# Altium schematic symbol library AA_Symbols.SchLib: 1017 symbols (part 6 of 7)
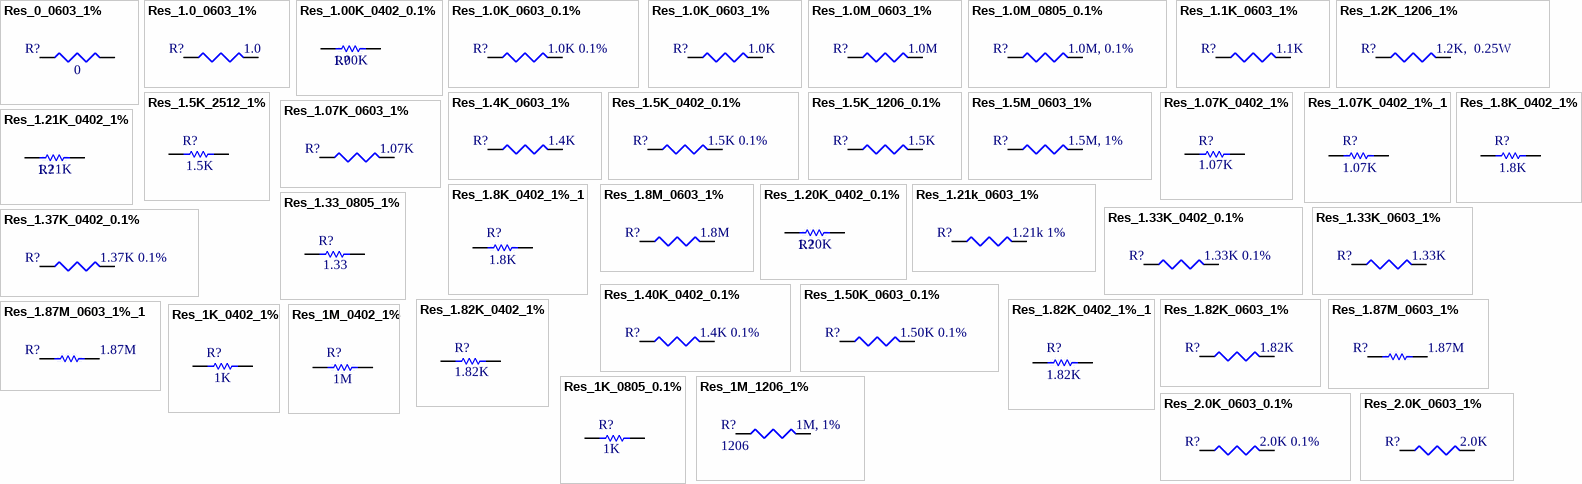
[diagram p47: symbols Res_0_0603_1% to Res_2.0K_0603_1%]

## Res_1.07K_0603_1%
designator R?, comment 1.07K
Resistor, 1.07K, 0603, 1%; Manufacturer: Stackpole; Manufacturer P/N: RMCF0603FT1K07; Outset P/N: 0000219; Value: 1.07K
footprint RC_1608_0603_N
pins: 1, 2

## Res_1.8K_0402_1%
designator R?, comment 1.8K
Resistor, 1.8K, 0402, 1%, 1/10W; Manufacturer P/N: ERJ-2RKF1801X; Manufacturer: Panasonic-ECG; Outset P/N: PN-0007234; TempCo: 100ppm/C; TOLERANCE: 1%; POWER: 1/10W; Value: 1.8K
footprint RC_1005_0402_L
footprint RC_1005_0402_N
pins: 1, 2

## Res_1.8K_0402_1%_1
designator R?, comment 1.8K
Resistor, 1.8K, 0402, 1%, 1/10W; Manufacturer P/N: ERJ-2RKF1801X; Manufacturer: Panasonic; Outset P/N: PN-0007068; TempCo: 100ppm/C; TOLERANCE: 1%; POWER: 1/10W; Value: 1.8K
footprint RC_1005_0402_L
pins: 1, 2

## Res_1.8M_0603_1%
designator R?, comment 1.8M
Resistor, 1.8M, 0603, 1%; Manufacturer: Stackpole; Manufacturer P/N: RMCF0603FT1M80; Outset P/N: 0000231; Value: 1.8M
footprint RC_1608_0603_N
pins: 1, 2

## Res_1.20K_0402_0.1%
designator R?, comment 1.20K
Resistor, 1.20K, 0402, 0.1%, 1/16W; Manufacturer P/N: RT0402BRE071K2L; Manufacturer: YAGEO; TempCo: 50ppm/C; Outset P/N: *; TOLERANCE: 0.1%; POWER: 1/16W; Value: 1.20K
footprint RC_1005_0402_L
pins: 1, 2

## Res_1.21K_0402_1%
designator R?, comment 1.21K
Resistor, 1.21K, 0402, 1%, 1/10W; Manufacturer P/N: ERJ-2RKF1211X; Manufacturer: Panasonic; Outset P/N: PN-0007067; TempCo: 100ppm/C; TOLERANCE: 1%; POWER: 1/10W; Value: 1.21K
footprint RC_1005_0402_L
pins: 1, 2

## Res_1.21k_0603_1%
designator R?, comment 1.21k 1%
Resistor, 1.21k, 0603, 1%; Manufacturer: Stackpole; Manufacturer P/N: RMCF0603FT1K21; Outset P/N: PN-0001684; Value: 1.21k 1%
footprint RC_1608_0603_N (Chip Resistor, 2-Leads, Body 1.5x0.8mm, IPC Medium Density)
pins: 1, 2

## Res_1.33_0805_1%
designator R?, comment 1.33
Resistor, 1.33, 0805, 1%, 1/8W; Manufacturer P/N: RC0805FR-071R33L; Manufacturer: Yageo; Outset P/N: PN0007279; TempCo: 200ppm/C; POWER: 1/8W; TOLERANCE: 1%; Value: 1.33
footprint RC_2012_0805_N
pins: 1, 2

## Res_1.33K_0402_0.1%
designator R?, comment 1.33K 0.1%
Resistor, 1.33K, 0402, 0.1%; Manufacturer: Yageo; Manufacturer P/N: RT0402BRD071K33L; Outset P/N: PN-0005551; Value: 1.33K 0.1%
footprint RC_1005_0402_N (Chip Resistor, 2-Leads, Body 1.0x0.5mm, IPC Medium Density)
pins: 1, 2

## Res_1.33K_0603_1%
designator R?, comment 1.33K
Resistor, 1.33K, 0603, 1%; Manufacturer: Stackpole Electronics Inc; Manufacturer P/N: RMCF0603FT1K33; Outset P/N: 0000227; Value: 1.33K
footprint RC_1608_0603_N
pins: 1, 2

## Res_1.37K_0402_0.1%
designator R?, comment 1.37K 0.1%
Resistor, 1.37K, 0402, 0.1%; Manufacturer: Yageo; Manufacturer P/N: RT0402BRD071K37L; Outset P/N: PN-0005552; Value: 1.37K 0.1%
footprint RC_1005_0402_N (Chip Resistor, 2-Leads, Body 1.0x0.5mm, IPC Medium Density)
pins: 1, 2

## Res_1.40K_0402_0.1%
designator R?, comment 1.4K 0.1%
Resistor, 1.40K, 0402, 0.1%; Manufacturer: Panasonic; Manufacturer P/N: ERA-2AEB1401X; Outset P/N: PN-0005899; Value: 1.4K 0.1%
footprint RC_1005_0402_N (Chip Resistor, 2-Leads, Body 1.0x0.5mm, IPC Medium Density)
pins: 1, 2

## Res_1.50K_0603_0.1%
designator R?, comment 1.50K 0.1%
Resistor, 1.50K, 0603, 0.1%; Manufacturer: Panasonic; Manufacturer P/N: ERA-3AEB152V; Outset P/N: 0000229; Value: 1.50K 0.1%
footprint RC_1608_0603_N
pins: 1, 2

## Res_1.82K_0402_1%
designator R?, comment 1.82K
Resistor, 1.82K, 0402, 1%, 1/10W; Manufacturer P/N: ERJ-2RKF1821X; Manufacturer: Panasonic-ECG; Outset P/N: PN-0007235; TempCo: 100ppm/C; TOLERANCE: 1%; POWER: 1/10W; Value: 1.82K
footprint RC_1005_0402_L
footprint RC_1005_0402_N
pins: 1, 2

## Res_1.82K_0402_1%_1
designator R?, comment 1.82K
Resistor, 1.82K, 0402, 1%, 1/10W; Manufacturer P/N: ERJ-2RKF1821X; Manufacturer: Panasonic; Outset P/N: PN-0007069; TempCo: 100ppm/C; TOLERANCE: 1%; POWER: 1/10W; Value: 1.82K
footprint RC_1005_0402_L
pins: 1, 2

## Res_1.82K_0603_1%
designator R?, comment 1.82K
Resistor, 1.82K, 0603, 1%; Manufacturer: Stackpole; Manufacturer P/N: RMCF0603FT1K82; Outset P/N: 0000230; Value: 1.82K
footprint RC_1608_0603_N
pins: 1, 2

## Res_1.87M_0603_1%
designator R?, comment 1.87M
Resistor, 1.87MOhms, 0603, 1%; Manufacturer: Stackpole Electronics Inc; Manufacturer P/N: RMCF0603FT1M87; Outset P/N: PN-0008388; Value: 1.87M
footprint RC_1608_0603_N (Chip Resistor, 2-Leads, Body 1.5x0.8mm, IPC Medium Density)
pins: 1, 2

## Res_1.87M_0603_1%_1
designator R?, comment 1.87M
Resistor, 1.87MOhms, 0603, 1%; Manufacturer: Stackpole Electronics Inc; Manufacturer P/N: RMCF0603FT1M87; Value: 1.87M
footprint RC_1608_0603_N (Chip Resistor, 2-Leads, Body 1.5x0.8mm, IPC Medium Density)
pins: 1, 2

## Res_1K_0402_1%
designator R?, comment 1K
Resistor, 1K, 0402, 1%, 1/10W; Manufacturer P/N: ERJ-2RKF1001X; Manufacturer: Panasonic-ECG; Outset P/N: PN-0007232; TempCo: 100ppm/C; TOLERANCE: 1%; POWER: 1/10W; Value: 1K
footprint RC_1005_0402_L
footprint RC_1005_0402_N
pins: 1, 2

## Res_1K_0805_0.1%
designator R?, comment 1K
Resistor, 1K, 0805, 0.1%, 1/4W; Manufacturer P/N: 1-2176092-8; Manufacturer: TE Connectivity; Outset P/N: PN-0007448; TempCo: 25ppm/C; POWER: 1/4W; TOLERANCE: 0.1%; Value: 1K
footprint RC_2012_0805_N
pins: 1, 2

## Res_1M_0402_1%
designator R?, comment 1M
Resistor, 1M, 0402, 1%, 1/10W; Manufacturer P/N: ERJ-2RKF1004X; Manufacturer: Panasonic-ECG; Outset P/N: PN-0007115; TempCo: 100ppm/C; TOLERANCE: 1%; POWER: 1/10W; Value: 1M
footprint RC_1005_0402_L
pins: 1, 2

## Res_1M_1206_1%
designator R?, comment Size: 1206  (hidden comment: 1M, 1%)
Resistor, 1M, 1206, 1%; Manufacturer: Panasonic; Manufacturer P/N: ERJ-8ENF1004V; Outset P/N: PN-0001678; Value: 1M, 1%
footprint RC_3216_1206_N (Chip Resistor, 2-Leads, Body 3.2x1.6mm, IPC Medium Density)
pins: 1, 2

## Res_2.0K_0603_0.1%
designator R?, comment 2.0K 0.1%
Resistor, 2.0K, 0603, 0.1%; Manufacturer: TE Connectivity; Manufacturer P/N: 6-1676481-1; Outset P/N: 0000252; Value: 2.0K 0.1%
footprint RC_1608_0603_N
pins: 1, 2

## Res_2.0K_0603_1%
designator R?, comment 2.0K
Resistor, 2.0K, 0603, 1%; Manufacturer: Stackpole; Manufacturer P/N: RMCF0603FT2K00; Outset P/N: 0000253; Value: 2.0K
footprint RC_1608_0603_N
pins: 1, 2

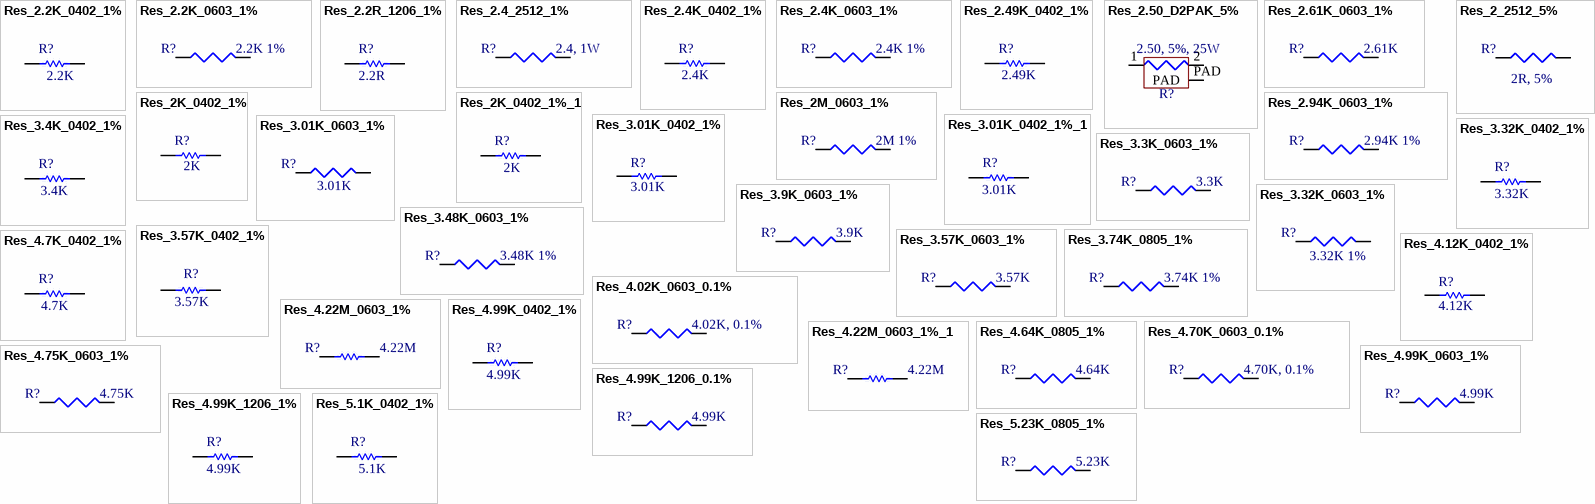
[diagram p32: symbols Res_2.2K_0402_1% to Res_5.23K_0805_1%]

## Res_2.2K_0402_1%
designator R?, comment 2.2K
Resistor, 2.2K, 0402, 1%, 1/10W; Manufacturer P/N: ERJ-2RKF2201X; Manufacturer: Panasonic; Outset P/N: PN-0007174; TempCo: 100ppm/C; TOLERANCE: 1%; POWER: 1/10W; Value: 2.2K
footprint RC_1005_0402_L
pins: 1, 2

## Res_2.2K_0603_1%
designator R?, comment 2.2K 1%
Resistor, 2.2k 0603, 1%; Manufacturer: Stackpole; Manufacturer P/N: RMCF0603FT2K20; Value: 2.2K 1%
footprint RC_1608_0603_N (Chip Resistor, 2-Leads, Body 1.5x0.8mm, IPC Medium Density)
pins: 1, 2

## Res_2.2R_1206_1%
designator R?, comment 2.2R
Resistor, 2.2R, 1206, 1%, 1/4W; Manufacturer P/N: ERJ-8RQF2R2V; Manufacturer: Panasonic-ECG; Outset P/N: PN-0008174; TempCo: 200ppm/C; TOLERANCE: 1%; POWER: 1/4W; Value: 2.2R
footprint RC_3216_1206_N
footprint RC_3216_1206_L
pins: 1, 2

## Res_2.4_2512_1%
designator R?, comment 2.4, 1W
Resistor, 2.4, 2512, 5%, 1W; Manufacturer: Vishay Dale; Manufacturer P/N: CRCW25122R40JNEG; Outset P/N: 0000254; Value: 2.4, 1W
footprint RC_6332_2512_N
pins: 1, 2

## Res_2.4K_0402_1%
designator R?, comment 2.4K
Resistor, 2.4K, 0402, 1%, 1/10W; Manufacturer P/N: ERJ-2RKF2401X; Manufacturer: Panasonic; Outset P/N: PN-0007071; TempCo: 100ppm/C; TOLERANCE: 1%; POWER: 1/10W; Value: 2.4K
footprint RC_1005_0402_L
pins: 1, 2

## Res_2.4K_0603_1%
designator R?, comment 2.4K 1%
Resistor, 2.4K, 0603, 1%; Manufacturer: Stackpole; Manufacturer P/N: RMCF0603FT2K40; Outset P/N: PN-0001753; Value: 2.4K 1%
footprint RC_1608_0603_N (Chip Resistor, 2-Leads, Body 1.5x0.8mm, IPC Medium Density)
pins: 1, 2

## Res_2.49K_0402_1%
designator R?, comment 2.49K
Resistor, 2.49K, 0402, 1%, 1/10W; Manufacturer P/N: ERJ-2RKF2491X; Manufacturer: Panasonic; Outset P/N: PN-0008276; TempCo: 100ppm/C; TOLERANCE: 1%; POWER: 1/10W; Value: 2.49K
footprint RC_1005_0402_L
pins: 1, 2

## Res_2.50_D2PAK_5%
designator R?, comment 2.50, 5%, 25W
Resistor, 2.50 D2PAK, 5%, 25W; Manufacturer: Bourns; Manufacturer P/N: PWR163S-25-2R50J; Outset P/N: 0000255; Value: 2.50, 5%, 25W
footprint D2PAK_LD_RES (D2-PAK, 3-Pads, Body 9.6x10.7mm (max), IPC Medium Density)
pins: 1, 2, PAD

## Res_2.61K_0603_1%
designator R?, comment 2.61K
Resistor, 2.61K, 0603, 1%; Manufacturer: Stackpole; Manufacturer P/N: RMCF0603FT2K61; Outset P/N: 0000256; Value: 2.61K
footprint RC_1608_0603_N
pins: 1, 2

## Res_2.94K_0603_1%
designator R?, comment 2.94K 1%
Resistor, 2.94K, 0603, 1%; Manufacturer: Panasonic; Manufacturer P/N: ERJ-3EKF2941V; Outset P/N: PN-0001718; Value: 2.94K 1%
footprint RC_1608_0603_N (Chip Resistor, 2-Leads, Body 1.5x0.8mm, IPC Medium Density)
pins: 1, 2

## Res_2_2512_5%
designator R?, comment 2R, 5%
Resistor, 2, 2512, 5%; Manufacturer: Vishay/Dale; Manufacturer P/N: CRCW25122R00JNEG; Outset P/N: PN-0001669; Value: 2R, 5%
footprint RC_6332_2512_N (Chip Resistor, 2-Leads, Body 6.3x3.2mm, IPC Medium Density)
pins: 1, 2

## Res_2K_0402_1%
designator R?, comment 2K
Resistor, 2K, 0402, 1%, 1/10W; Manufacturer P/N: ERJ-2RKF2001X; Manufacturer: Panasonic-ECG; Outset P/N: PN-0007236; TempCo: 100ppm/C; TOLERANCE: 1%; POWER: 1/10W; Value: 2K
footprint RC_1005_0402_L
footprint RC_1005_0402_N
pins: 1, 2

## Res_2K_0402_1%_1
designator R?, comment 2K
Resistor, 2K, 0402, 1%, 1/10W; Manufacturer P/N: ERJ-2RKF2001X; Manufacturer: Panasonic; Outset P/N: PN-0007070; TempCo: 100ppm/C; TOLERANCE: 1%; POWER: 1/10W; Value: 2K
footprint RC_1005_0402_L
pins: 1, 2

## Res_2M_0603_1%
designator R?, comment 2M 1%
Resistor, 2M, 0603, 1%; Manufacturer: Stackpole; Manufacturer P/N: RMCF0603FT2M00; Outset P/N: PN-0001767; Value: 2M 1%
footprint RC_1608_0603_N (Chip Resistor, 2-Leads, Body 1.5x0.8mm, IPC Medium Density)
pins: 1, 2

## Res_3.01K_0402_1%
designator R?, comment 3.01K
Resistor, 3.01K, 0402, 1%, 1/10W; Manufacturer P/N: ERJ-2RKF3011X; Manufacturer: Panasonic-ECG; Outset P/N: PN-0007237; TempCo: 100ppm/C; TOLERANCE: 1%; POWER: 1/10W; Value: 3.01K
footprint RC_1005_0402_L
footprint RC_1005_0402_N
pins: 1, 2

## Res_3.01K_0402_1%_1
designator R?, comment 3.01K
Resistor, 3.01K, 0402, 1%, 1/10W; Manufacturer P/N: ERJ-2RKF3011X; Manufacturer: Panasonic-ECG; Outset P/N: PN-0007072; TempCo: 100ppm/C; TOLERANCE: 1%; POWER: 1/10W; Value: 3.01K
footprint RC_1005_0402_L
pins: 1, 2

## Res_3.01K_0603_1%
designator R?, comment 3.01K
Resistor, 3.01K, 0603, 1%; Manufacturer: Stackpole; Manufacturer P/N: RMCF0603FT3K01; Outset P/N: 0000273; Value: 3.01K
footprint RC_1608_0603_N
pins: 1, 2

## Res_3.3K_0603_1%
designator R?, comment 3.3K
Resistor, 3.30K, 0603, 1%; Manufacturer: Stackpole Electronics Inc; Manufacturer P/N: RMCF0603FT3K30; Outset P/N: 0000274; Value: 3.3K
footprint RC_1608_0603_N
pins: 1, 2

## Res_3.4K_0402_1%
designator R?, comment 3.4K
Resistor, 3.4K, 0402, 1%, 1/10W; Manufacturer P/N: ERJ-2RKF3401X; Manufacturer: Panasonic-ECG; Outset P/N: PN-0007074; TempCo: 100ppm/C; TOLERANCE: 1%; POWER: 1/10W; Value: 3.4K
footprint RC_1005_0402_L
pins: 1, 2

## Res_3.9K_0603_1%
designator R?, comment 3.9K
Resistor, 3.9K, 0603, 1%; Manufacturer: Stackpole Electronics Inc; Manufacturer P/N: RMCF0603FT3K90; Outset P/N: 0000276; Value: 3.9K
footprint RC_1608_0603_N
pins: 1, 2

## Res_3.32K_0402_1%
designator R?, comment 3.32K
Resistor, 3.32K, 0402, 1%, 1/10W; Manufacturer P/N: ERJ-2RKF3321X; Manufacturer: Panasonic-ECG; Outset P/N: PN-0007073; TempCo: 100ppm/C; TOLERANCE: 1%; POWER: 1/10W; Value: 3.32K
footprint RC_1005_0402_L
pins: 1, 2

## Res_3.32K_0603_1%
designator R?, comment 3.32K 1%
Resistor, 3.32K, 0603, 1%; Manufacturer: Stackpole; Manufacturer P/N: RMCF0603FT3K32; Outset P/N: PN-0001724; Value: 3.32K 1%
footprint RC_1608_0603_N (Chip Resistor, 2-Leads, Body 1.5x0.8mm, IPC Medium Density)
pins: 1, 2

## Res_3.48K_0603_1%
designator R?, comment 3.48K 1%
Resistor, 3.48K, 0603, 1%; Manufacturer: Panasonic; Manufacturer P/N: ERJ-3EKF3481V; Outset P/N: PN-0001717; Value: 3.48K 1%
footprint RC_1608_0603_N (Chip Resistor, 2-Leads, Body 1.5x0.8mm, IPC Medium Density)
pins: 1, 2

## Res_3.57K_0402_1%
designator R?, comment 3.57K
Resistor, 3.57K, 0402, 1%, 1/10W; Manufacturer P/N: ERJ-2RKF3571X; Manufacturer: Panasonic-ECG; Outset P/N: PN-0007075; TempCo: 100ppm/C; TOLERANCE: 1%; POWER: 1/10W; Value: 3.57K
footprint RC_1005_0402_L
pins: 1, 2

## Res_3.57K_0603_1%
designator R?, comment 3.57K
Resistor, 3.57K, 0603, 1%; Manufacturer: Stackpole Electronics Inc; Manufacturer P/N: RMCF0603FT3K57; Outset P/N: 0000275; Value: 3.57K
footprint RC_1608_0603_N
pins: 1, 2

## Res_3.74K_0805_1%
designator R?, comment 3.74K 1%
Resistor, 3.74K, 0805, 1%; Manufacturer: Panasonic; Manufacturer P/N: RMCF0805FT3K74; Outset P/N: PN-0001725; Value: 3.74K 1%
footprint RC_2012_0805_N (Chip Resistor, 2-Leads, Body 2.0x1.3mm, IPC Medium Density)
pins: 1, 2

## Res_4.02K_0603_0.1%
designator R?, comment 4.02K, 0.1%
Resistor, 4.02K, 0603, 0.1%; Manufacturer: Panasonic - ERA; Manufacturer P/N: ERA-3AEB4021V; Outset P/N: 0000286; Value: 4.02K, 0.1%
footprint RC_1608_0603_N
pins: 1, 2

## Res_4.7K_0402_1%
designator R?, comment 4.7K
Resistor, 4.7K, 0402, 1%, 1/10W; Manufacturer P/N: ERJ-2RKF4701X; Manufacturer: Panasonic-ECG; Outset P/N: PN-0007076; TempCo: 100ppm/C; TOLERANCE: 1%; POWER: 1/10W; Value: 4.7K
footprint RC_1005_0402_L
pins: 1, 2

## Res_4.12K_0402_1%
designator R?, comment 4.12K
Resistor, 4.12K, 0402, 1%, 1/10W; Manufacturer P/N: ERJ-2RKF4121X; Manufacturer: Panasonic-ECG; Outset P/N: PN-0007238; TempCo: 100ppm/C; TOLERANCE: 1%; POWER: 1/10W; Value: 4.12K
footprint RC_1005_0402_L
footprint RC_1005_0402_N
pins: 1, 2

## Res_4.22M_0603_1%
designator R?, comment 4.22M
Resistor, 4.22MOhms, 0603, 1%; Manufacturer: Stackpole Electronics Inc; Manufacturer P/N: RMCF0603FT4M22; Outset P/N: PN-0008387; Value: 4.22M
footprint RC_1608_0603_N (Chip Resistor, 2-Leads, Body 1.5x0.8mm, IPC Medium Density)
pins: 1, 2

## Res_4.22M_0603_1%_1
designator R?, comment 4.22M
Resistor, 4.22MOhms, 0603, 1%; Manufacturer: Stackpole Electronics Inc; Manufacturer P/N: RMCF0603FT4M22; Value: 4.22M
footprint RC_1608_0603_N (Chip Resistor, 2-Leads, Body 1.5x0.8mm, IPC Medium Density)
pins: 1, 2

## Res_4.64K_0805_1%
designator R?, comment 4.64K
Resistor, 4.64K, 0805, 1%; Manufacturer: Yageo; Manufacturer P/N: RC0805FR-074K64L; Outset P/N: PN-0003754; Value: 4.64K
footprint RC_2012_0805_N (Chip Resistor, 2-Leads, Body 2.0x1.3mm, IPC Medium Density)
pins: 1, 2

## Res_4.70K_0603_0.1%
designator R?, comment 4.70K, 0.1%
Resistor, 4.70K, 0603, 0.1%; Manufacturer: Panasonic - ECG; Manufacturer P/N: ERA-3AEB472V; Outset P/N: 0000287; Value: 4.70K, 0.1%
footprint RC_1608_0603_N
pins: 1, 2

## Res_4.75K_0603_1%
designator R?, comment 4.75K
Resistor, 4.75K, 0603, 1%; Manufacturer: Stackpole; Manufacturer P/N: RMCF0603FT4K75; Outset P/N: 0000288; Value: 4.75K
footprint RC_1608_0603_N
pins: 1, 2

## Res_4.99K_0402_1%
designator R?, comment 4.99K
Resistor, 4.99K, 0402, 1%, 1/10W; Manufacturer P/N: ERJ-2RKF4991X; Manufacturer: Panasonic-ECG; Outset P/N: PN-0007077; TempCo: 100ppm/C; TOLERANCE: 1%; POWER: 1/10W; Value: 4.99K
footprint RC_1005_0402_L
pins: 1, 2

## Res_4.99K_0603_1%
designator R?, comment 4.99K
Resistor, 4.99K, 0603, 1%; Manufacturer: Stackpole Electronics Inc; Manufacturer P/N: RMCF0603FT4K99; Outset P/N: 0000289; Value: 4.99K
footprint RC_1608_0603_N
pins: 1, 2

## Res_4.99K_1206_0.1%
designator R?, comment 4.99K
Resistor, 4.99K, 1206, 0.1%, 0.4W; Manufacturer: Panasonic; Manufacturer P/N: ERA-8ARB4991V; Outset P/N: PN-0007426; Tolerance: 0.1%; Value: 4.99K
footprint RC_3216_1206_N
pins: 1, 2

## Res_4.99K_1206_1%
designator R?, comment 4.99K
Resistor, 4.99K, 1206, 1%, 1/4W; Manufacturer P/N: ERJ-8ENF4991V; Manufacturer: Panasonic-ECG; Outset P/N: PN-0007123; TempCo: 100ppm/C; TOLERANCE: 1%; POWER: 1/4W; Value: 4.99K
footprint RC_3216_1206_N
footprint RC_3216_1206_L
pins: 1, 2

## Res_5.1K_0402_1%
designator R?, comment 5.1K
Resistor, 5.1K, 0402, 1%, 1/10W; Manufacturer P/N: ERJ-2RKF5101X; Manufacturer: Panasonic; Outset P/N: PN-0007177; TempCo: 100ppm/C; TOLERANCE: 1%; POWER: 1/10W; Value: 5.1K
footprint RC_1005_0402_L
pins: 1, 2

## Res_5.23K_0805_1%
designator R?, comment 5.23K
Resistor, 5.23K, 0805, 1%; Manufacturer: Panasonic; Manufacturer P/N: ERJ-6ENF5231V; Outset P/N: PN-0003759; Value: 5.23K
footprint RC_2012_0805_N (Chip Resistor, 2-Leads, Body 2.0x1.3mm, IPC Medium Density)
pins: 1, 2

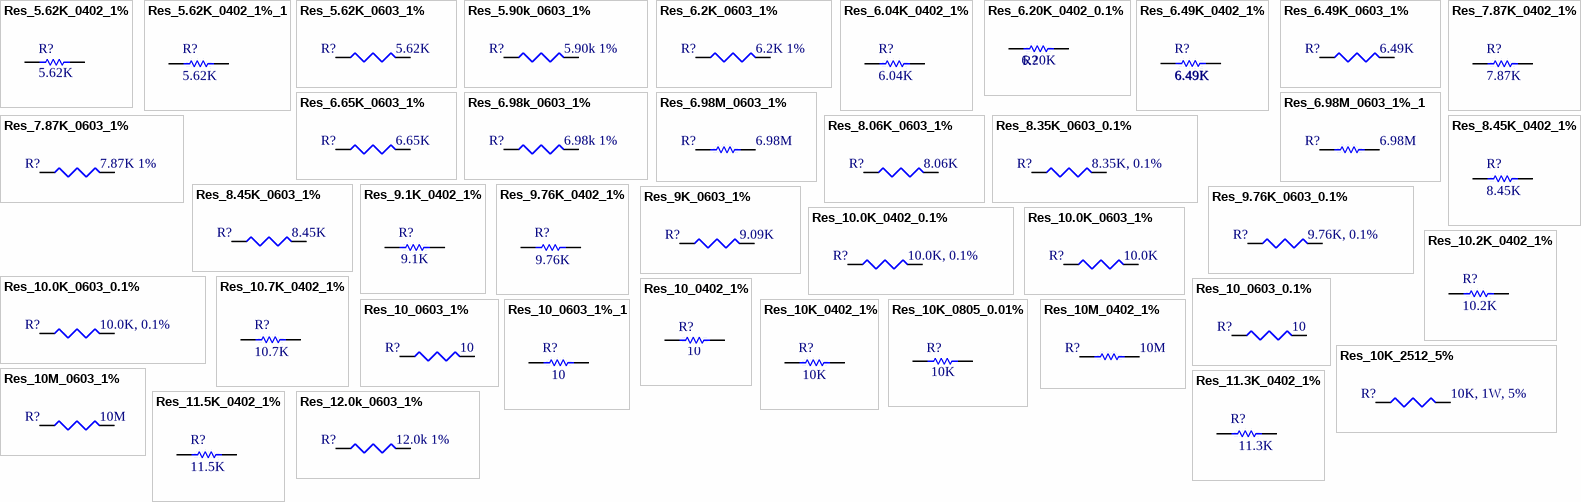
[diagram p33: symbols Res_5.62K_0402_1% to Res_12.0k_0603_1%]

## Res_5.62K_0402_1%
designator R?, comment 5.62K
Resistor, 5.62K, 0402, 1%, 1/10W; Manufacturer P/N: ERJ-2RKF5621X; Manufacturer: Panasonic-ECG; Outset P/N: PN-0007239; TempCo: 100ppm/C; TOLERANCE: 1%; POWER: 1/10W; Value: 5.62K
footprint RC_1005_0402_L
footprint RC_1005_0402_N
pins: 1, 2

## Res_5.62K_0402_1%_1
designator R?, comment 5.62K
Resistor, 5.62K, 0402, 1%, 1/10W; Manufacturer P/N: ERJ-2RKF5621X; Manufacturer: Panasonic-ECG; Outset P/N: PN-0007078; TempCo: 100ppm/C; TOLERANCE: 1%; POWER: 1/10W; Value: 5.62K
footprint RC_1005_0402_L
pins: 1, 2

## Res_5.62K_0603_1%
designator R?, comment 5.62K
Resistor, 5.62K, 0603, 1%; Manufacturer: Stackpole; Manufacturer P/N: RMCF0603FT5K62; Outset P/N: 0000295; Value: 5.62K
footprint RC_1608_0603_N
pins: 1, 2

## Res_5.90k_0603_1%
designator R?, comment 5.90k 1%
Resistor, 5.90k, 0603, 1%; Manufacturer: Stackpole; Manufacturer P/N: RMCF0603FT5K90; Outset P/N: PN-0001742; Value: 5.90k 1%
footprint RC_1608_0603_N (Chip Resistor, 2-Leads, Body 1.5x0.8mm, IPC Medium Density)
pins: 1, 2

## Res_6.2K_0603_1%
designator R?, comment 6.2K 1%
Resistor, 6.2K, 0603, 1%; Manufacturer: Panasonic; Manufacturer P/N: ERJ-3EKF6201V; Outset P/N: PN-0001716; Value: 6.2K 1%
footprint RC_1608_0603_N (Chip Resistor, 2-Leads, Body 1.5x0.8mm, IPC Medium Density)
pins: 1, 2

## Res_6.04K_0402_1%
designator R?, comment 6.04K
Resistor, 6.04K, 0402, 1%, 1/10W; Manufacturer P/N: ERJ-2RKF6041X; Manufacturer: Panasonic-ECG; Outset P/N: PN-0007079; TempCo: 100ppm/C; TOLERANCE: 1%; POWER: 1/10W; Value: 6.04K
footprint RC_1005_0402_L
pins: 1, 2

## Res_6.20K_0402_0.1%
designator R?, comment 6.20K
Resistor, 6.20K, 0402, 0.1%, 1/16W; Manufacturer P/N: RT0402BRD076K2L; Manufacturer: YAGEO; TempCo: 25ppm/C; Outset P/N: *; TOLERANCE: 0.1%; POWER: 1/16W; Value: 6.20K
footprint RC_1005_0402_L
pins: 1, 2

## Res_6.49K_0402_1%
designator R?, comment 6.49K
Resistor, 6.49K, 0402, 1%, 1/10W; Manufacturer P/N: ERJ-2RKF6491X; Manufacturer: Panasonic-ECG; Outset P/N: PN-0007080; TempCo: 100ppm/C; TOLERANCE: 1%; POWER: 1/10W; Value: 6.49K
footprint RC_1005_0402_L
pins: 1, 2

## Res_6.49K_0603_1%
designator R?, comment 6.49K
Resistor, 6.49K, 0603, 1%; Manufacturer: Stackpole Electronics Inc; Manufacturer P/N: RMCF0603FT6K49; Outset P/N: 0000298; Value: 6.49K
footprint RC_1608_0603_N
pins: 1, 2

## Res_6.65K_0603_1%
designator R?, comment 6.65K
Resistor, 6.65K, 0603, 1%; Manufacturer: Stackpole Electronics Inc; Manufacturer P/N: RMCF0603FT6K65; Outset P/N: 0000299; Value: 6.65K
footprint RC_1608_0603_N
pins: 1, 2

## Res_6.98k_0603_1%
designator R?, comment 6.98k 1%
Resistor, 6.98k, 0603, 1%; Manufacturer: Stackpole; Manufacturer P/N: RMCF0603FT6K98; Outset P/N: PN-0001741; Value: 6.98k 1%
footprint RC_1608_0603_N (Chip Resistor, 2-Leads, Body 1.5x0.8mm, IPC Medium Density)
pins: 1, 2

## Res_6.98M_0603_1%
designator R?, comment 6.98M
Resistor, 6.98MOhms, 0603, 1%; Manufacturer: Stackpole Electronics Inc; Manufacturer P/N: RMCF0603FT6M98; Outset P/N: PN-0008389; Value: 6.98M
footprint RC_1608_0603_N (Chip Resistor, 2-Leads, Body 1.5x0.8mm, IPC Medium Density)
pins: 1, 2

## Res_6.98M_0603_1%_1
designator R?, comment 6.98M
Resistor, 6.98MOhms, 0603, 1%; Manufacturer: Stackpole Electronics Inc; Manufacturer P/N: RMCF0603FT6M98; Value: 6.98M
footprint RC_1608_0603_N (Chip Resistor, 2-Leads, Body 1.5x0.8mm, IPC Medium Density)
pins: 1, 2

## Res_7.87K_0402_1%
designator R?, comment 7.87K
Resistor, 7.87K, 0402, 1%, 1/10W; Manufacturer P/N: ERJ-2RKF7871X; Manufacturer: Panasonic-ECG; Outset P/N: PN-0007081; TempCo: 100ppm/C; TOLERANCE: 1%; POWER: 1/10W; Value: 7.87K
footprint RC_1005_0402_L
pins: 1, 2

## Res_7.87K_0603_1%
designator R?, comment 7.87K 1%
Resistor, 7.87K, 0603, 1%; Manufacturer: Panasonic; Manufacturer P/N: ERJ3EKF7871V; Outset P/N: PN-0002768; Value: 7.87K 1%
footprint RC_1608_0603_N (Chip Resistor, 2-Leads, Body 1.5x0.8mm, IPC Medium Density)
pins: 1, 2

## Res_8.06K_0603_1%
designator R?, comment 8.06K
Resistor, 8.06K, 0603, 1%; Manufacturer: Stackpole Electronics Inc; Manufacturer P/N: RMCF0603FT8K06; Outset P/N: 0000305; Value: 8.06K
footprint RC_1608_0603_N
pins: 1, 2

## Res_8.35K_0603_0.1%
designator R?, comment 8.35K, 0.1%
Resistor, 8.35K, 0603, 0.1%, 1/4W; Manufacturer: Vishay Dale; Manufacturer P/N: PTN0603E8351BST1; Outset P/N: *; Value: 8.35K, 0.1%
footprint RC_1608_0603_N
pins: 1, 2

## Res_8.45K_0402_1%
designator R?, comment 8.45K
Resistor, 8.45K, 0402, 1%, 1/10W; Manufacturer P/N: ERJ-2RKF8451X; Manufacturer: Panasonic-ECG; Outset P/N: PN-0007082; TempCo: 100ppm/C; TOLERANCE: 1%; POWER: 1/10W; Value: 8.45K
footprint RC_1005_0402_L
pins: 1, 2

## Res_8.45K_0603_1%
designator R?, comment 8.45K
Resistor, 8.45K, 0603, 1%; Manufacturer: Stackpole Electronics Inc; Manufacturer P/N: RMCF0603FT8K45; Outset P/N: 0000306; Value: 8.45K
footprint RC_1608_0603_N
pins: 1, 2

## Res_9.1K_0402_1%
designator R?, comment 9.1K
Resistor, 9.1K, 0402, 1%, 1/10W; Manufacturer P/N: ERJ-2RKF9101X; Manufacturer: Panasonic-ECG; Outset P/N: PN-0007083; TempCo: 100ppm/C; TOLERANCE: 1%; POWER: 1/10W; Value: 9.1K
footprint RC_1005_0402_L
pins: 1, 2

## Res_9.76K_0402_1%
designator R?, comment 9.76K
Resistor, 9.76K, 0402, 1%, 1/10W; Manufacturer P/N: ERJ-2RKF9761X; Manufacturer: Panasonic-ECG; Outset P/N: PN-0007240; TempCo: 100ppm/C; TOLERANCE: 1%; POWER: 1/10W; Value: 9.76K
footprint RC_1005_0402_L
footprint RC_1005_0402_N
pins: 1, 2

## Res_9.76K_0603_0.1%
designator R?, comment 9.76K, 0.1%
Resistor, 9.76K, 0603, 0.1%; Manufacturer: Panasonic - ECG; Manufacturer P/N: ERA-3AEB9761V; Outset P/N: 0000311; Value: 9.76K, 0.1%
footprint RC_1608_0603_N
pins: 1, 2

## Res_9K_0603_1%
designator R?, comment 9.09K
Resistor, 9.09K, 0603, 1%; Manufacturer: Stackpole Electronics Inc; Manufacturer P/N: RMCF0603FT9K09; Outset P/N: 0000313; Value: 9.09K
footprint RC_1608_0603_N
pins: 1, 2

## Res_10.0K_0402_0.1%
designator R?, comment 10.0K, 0.1%
Resistor, 10.0K, 0402, 0.1%; Manufacturer: Vishay; Manufacturer P/N: MCS04020D1002BE100; Outset P/N: PN-0001467; Value: 10.0K, 0.1%
footprint RC_1005_0402_N (Chip Resistor, 2-Leads, Body 1.0x0.5mm, IPC Medium Density)
pins: 1, 2

## Res_10.0K_0603_0.1%
designator R?, comment 10.0K, 0.1%
Resistor, 10.0K, 0603, 0.1%; Manufacturer: Panasonic - ECG; Manufacturer P/N: ERA-3AEB103V; Outset P/N: 0000232; Value: 10.0K, 0.1%
footprint RC_1608_0603_N
pins: 1, 2

## Res_10.0K_0603_1%
designator R?, comment 10.0K
Resistor, 10.0K, 0603, 1%; Manufacturer: Stackpole; Manufacturer P/N: RMCF0603FT10K0; Outset P/N: 0000233; Value: 10.0K
footprint RC_1608_0603_N
pins: 1, 2

## Res_10.2K_0402_1%
designator R?, comment 10.2K
Resistor, 10.2K, 0402, 1%, 1/10W; Manufacturer P/N: ERJ-2RKF1022X; Manufacturer: Panasonic-ECG; Outset P/N: PN-0007086; TempCo: 100ppm/C; TOLERANCE: 1%; POWER: 1/10W; Value: 10.2K
footprint RC_1005_0402_L
pins: 1, 2

## Res_10.7K_0402_1%
designator R?, comment 10.7K
Resistor, 10.7K, 0402, 1%, 1/10W; Manufacturer P/N: ERJ-2RKF1072X; Manufacturer: Panasonic-ECG; Outset P/N: PN-0007422; TempCo: 100ppm/C; TOLERANCE: 1%; POWER: 1/10W; Value: 10.7K
footprint RC_1005_0402_L
pins: 1, 2

## Res_10_0402_1%
designator R?, comment 10
Resistor, 10, 0402, 1%, 1/10W; Manufacturer P/N: ERJ-2RKF10R0X; Manufacturer: Panasonic-ECG; Outset P/N: PN-0007226; TempCo: 100ppm/C; TOLERANCE: 1%; POWER: 1/10W; Value: 10
footprint RC_1005_0402_L
footprint RC_1005_0402_N
pins: 1, 2

## Res_10_0603_0.1%
designator R?, comment 10
Resistor, 10, 0603, 0.1%; Manufacturer: TE Connectivity; Manufacturer P/N: CPF0603B10RE1; Outset P/N: PN-0007447; Tolerance: 0.1%; Value: 10
footprint RC_1608_0603_N
pins: 1, 2

## Res_10_0603_1%
designator R?, comment 10
Resistor, 10, 0603, 1%; Manufacturer: Stackpole; Manufacturer P/N: RMCF0603FT10R0; Outset P/N: 0000241; Value: 10
footprint RC_1608_0603_N
pins: 1, 2

## Res_10_0603_1%_1
designator R?, comment 10
Resistor, 10, 0603, 1%, 1/10W; Manufacturer P/N: ERJ-3EKF10R0V; Manufacturer: Panasonic-ECG; Outset P/N: PN-0007117; TempCo: 100ppm/C; POWER: 1/10W; TOLERANCE: 1%; Value: 10
footprint RC_1608_0603_N
footprint RC_1608_0603_L
pins: 1, 2

## Res_10K_0402_1%
designator R?, comment 10K
Resistor, 10K, 0402, 1%, 1/16W; Manufacturer P/N: AC0402FR-0710KL; Manufacturer: Yageo; Outset P/N: PN-0007057; TempCo: 100ppm/C; TYPE: Thick Film Chip Resistor; TOLERANCE: 1%; POWER: 1/16W; VALUE: 10K
footprint RC_1005_0402_L
pins: 1, 2

## Res_10K_0805_0.01%
designator R?, comment 10K
Resistor, 10K, 0805, 0.01%, 1/8W; Manufacturer P/N: RNCF0805TKY10K0; Manufacturer: Stackpole; Outset P/N: PN-0007429; TempCo: 5ppm/C; POWER: 1/8W; TOLERANCE: 0.01%; Value: 10K
footprint RC_2012_0805_N
pins: 1, 2

## Res_10K_2512_5%
designator R?, comment 10K, 1W, 5%
Resistor, 10K, 2512, 5%, 1W; Manufacturer: Stackpole; Manufacturer P/N: RMCF2512JT10K0; Outset P/N: 0000239; Value: 10K, 1W, 5%
footprint RC_6332_2512_N
pins: 1, 2

## Res_10M_0402_1%
designator R?, comment 10M
Resistor, 10M, 0402, 1%; Manufacturer: Yageo; Manufacturer P/N: RC0402FR-0710ML; Outset P/N: PN-0001468; Value: 10M
footprint RC_1005_0402_L
pins: 1, 2

## Res_10M_0603_1%
designator R?, comment 10M
Resistor, 10M, 0603, 1%; Manufacturer: Stackpole; Manufacturer P/N: RMCF0603FT10M0; Outset P/N: 0000240; Value: 10M
footprint RC_1608_0603_N
pins: 1, 2

## Res_11.3K_0402_1%
designator R?, comment 11.3K
Resistor, 11.3K, 0402, 1%, 1/16W; Manufacturer P/N: CRCW040211K3FKED; Manufacturer: Vishay Dale; Outset P/N: PN-0008171; TempCo: 100ppm/C; TOLERANCE: 1%; POWER: 1/16W; Value: 11.3K
footprint RC_1005_0402_L
pins: 1, 2

## Res_11.5K_0402_1%
designator R?, comment 11.5K
Resistor, 11.5K, 0402, 1%, 1/10W; Manufacturer P/N: ERJ-2RKF1152X; Manufacturer: Panasonic-ECG; Outset P/N: PN-0007087; TempCo: 100ppm/C; TOLERANCE: 1%; POWER: 1/10W; Value: 11.5K
footprint RC_1005_0402_L
pins: 1, 2

## Res_12.0k_0603_1%
designator R?, comment 12.0k 1%
Resistor, 12.0k, 0603, 1%; Manufacturer: Stackpole; Manufacturer P/N: RMCF0603FT12K0; Outset P/N: PN-0001735; Value: 12.0k 1%
footprint RC_1608_0603_N (Chip Resistor, 2-Leads, Body 1.5x0.8mm, IPC Medium Density)
pins: 1, 2
